# Altium schematic symbol library 724452_RPL-HX_Mobile_AEP_Rev0p91_Library.SchLib: 162 symbols (part 3 of 5) (continued)
## DDR5_SODIMM_2X131_2EM (continued)
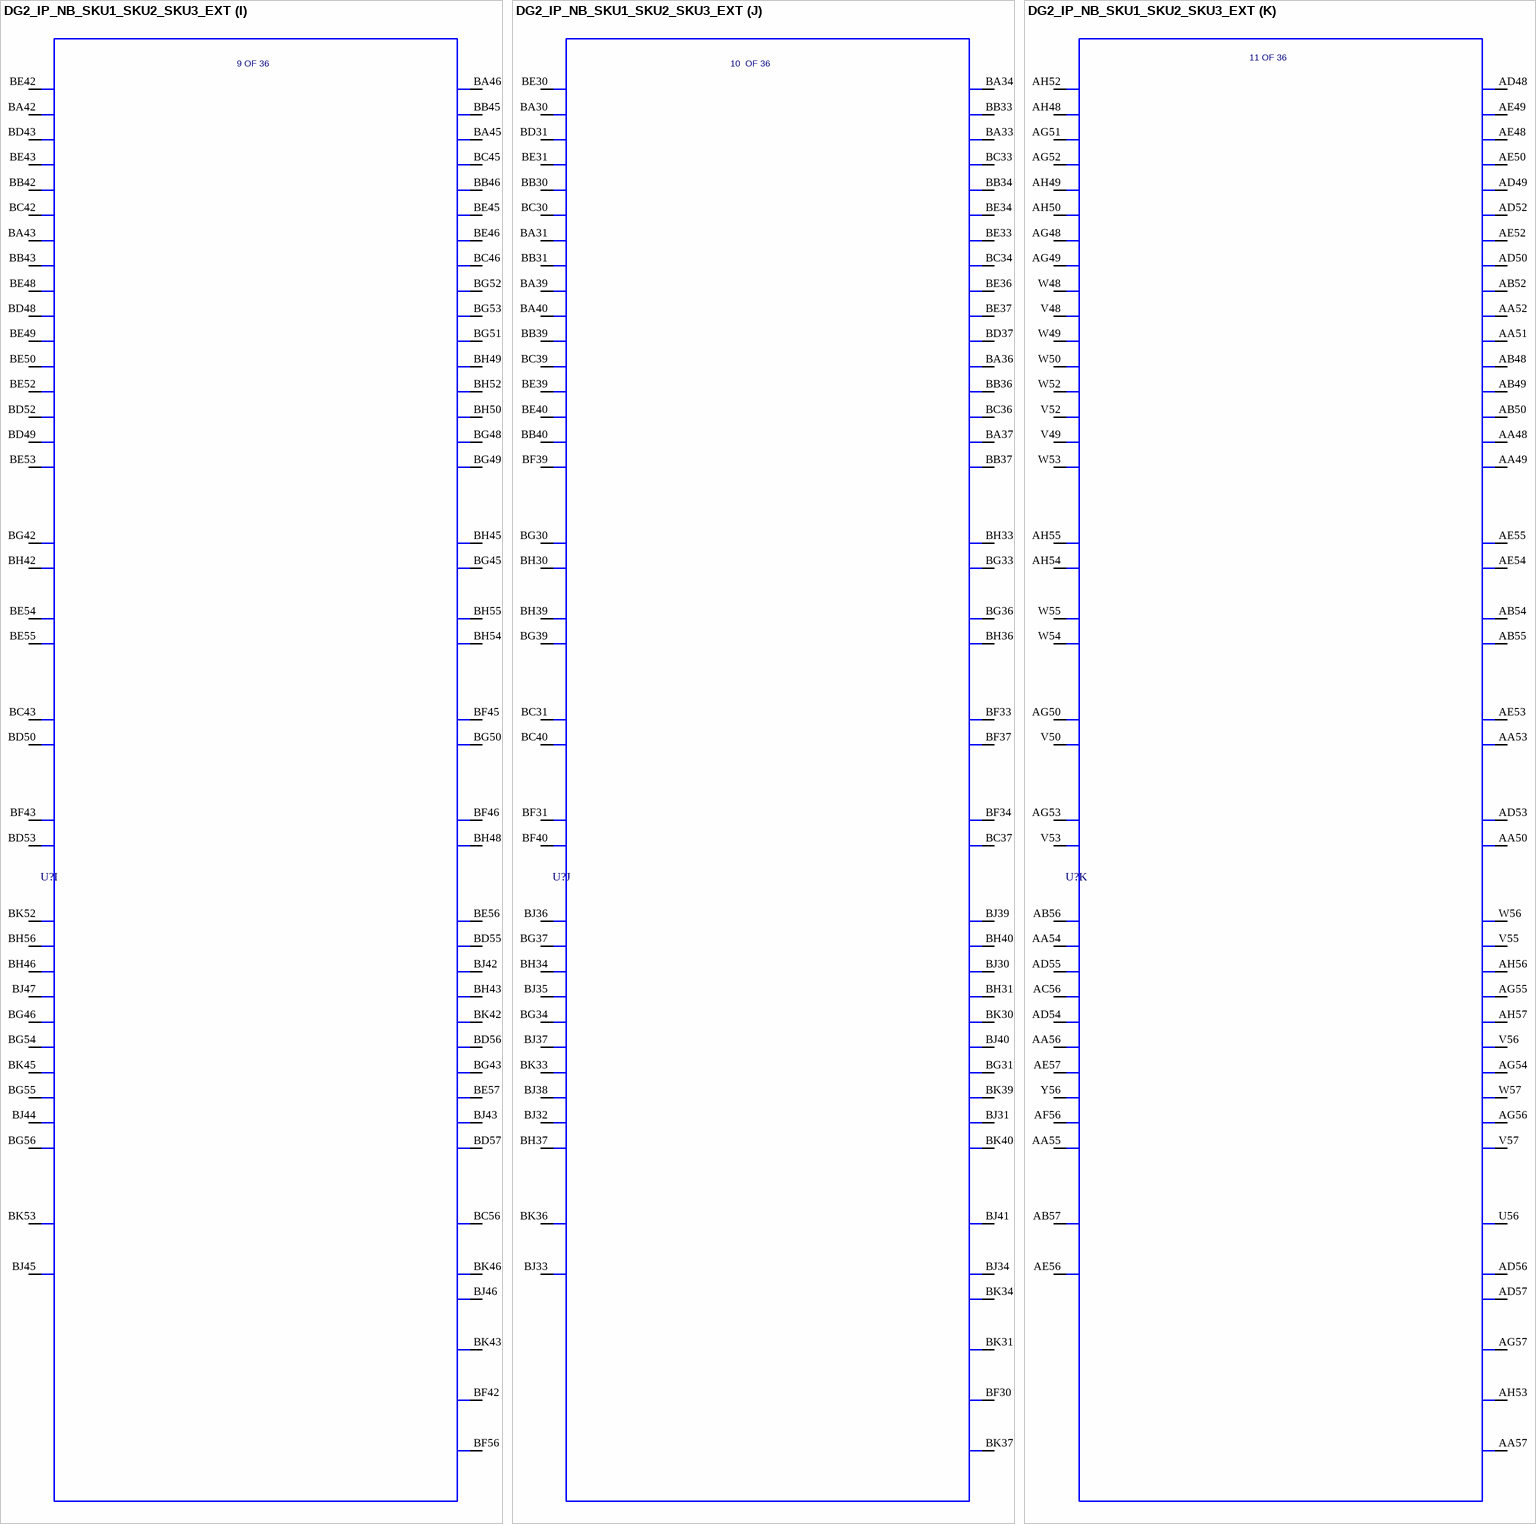
[diagram p30: symbol DG2_IP_NB_SKU1_SKU2_SKU3_EXT]
part A text: DQS4_A_N; DQS3_A_N; DQS2_A_N; DQS1_A_N; DQS0_A_N; CK1_A_N; CK0_A_N
part B text: DQS4_B_N; DQS3_B_N; DQS2_B_N; DQS1_B_N; DQS0_B_N; CK1_B_N; CK0_B_N
part C text: VIN_BULK; RFU; MP; VSS

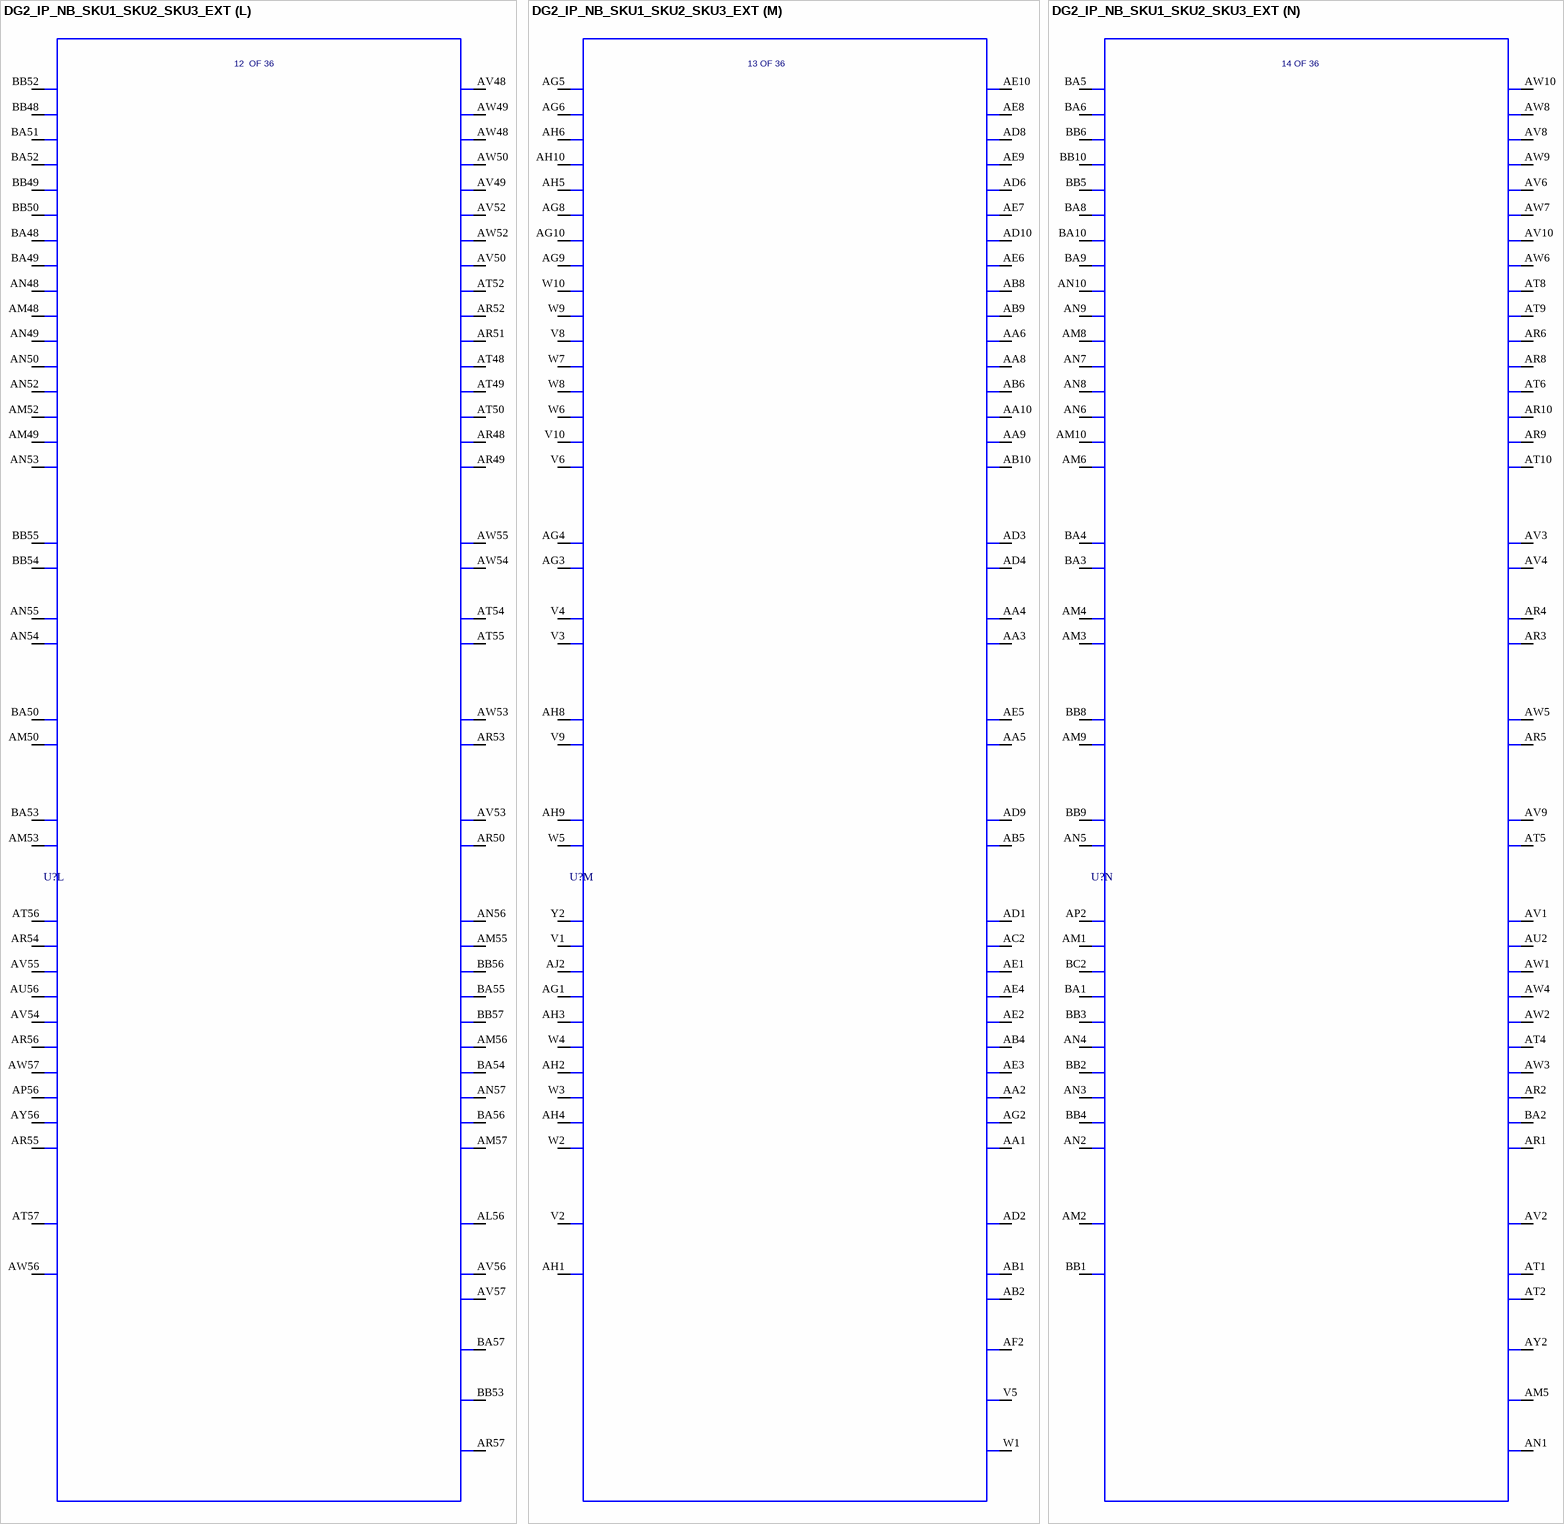
[diagram p31: symbol DG2_IP_NB_SKU1_SKU2_SKU3_EXT]

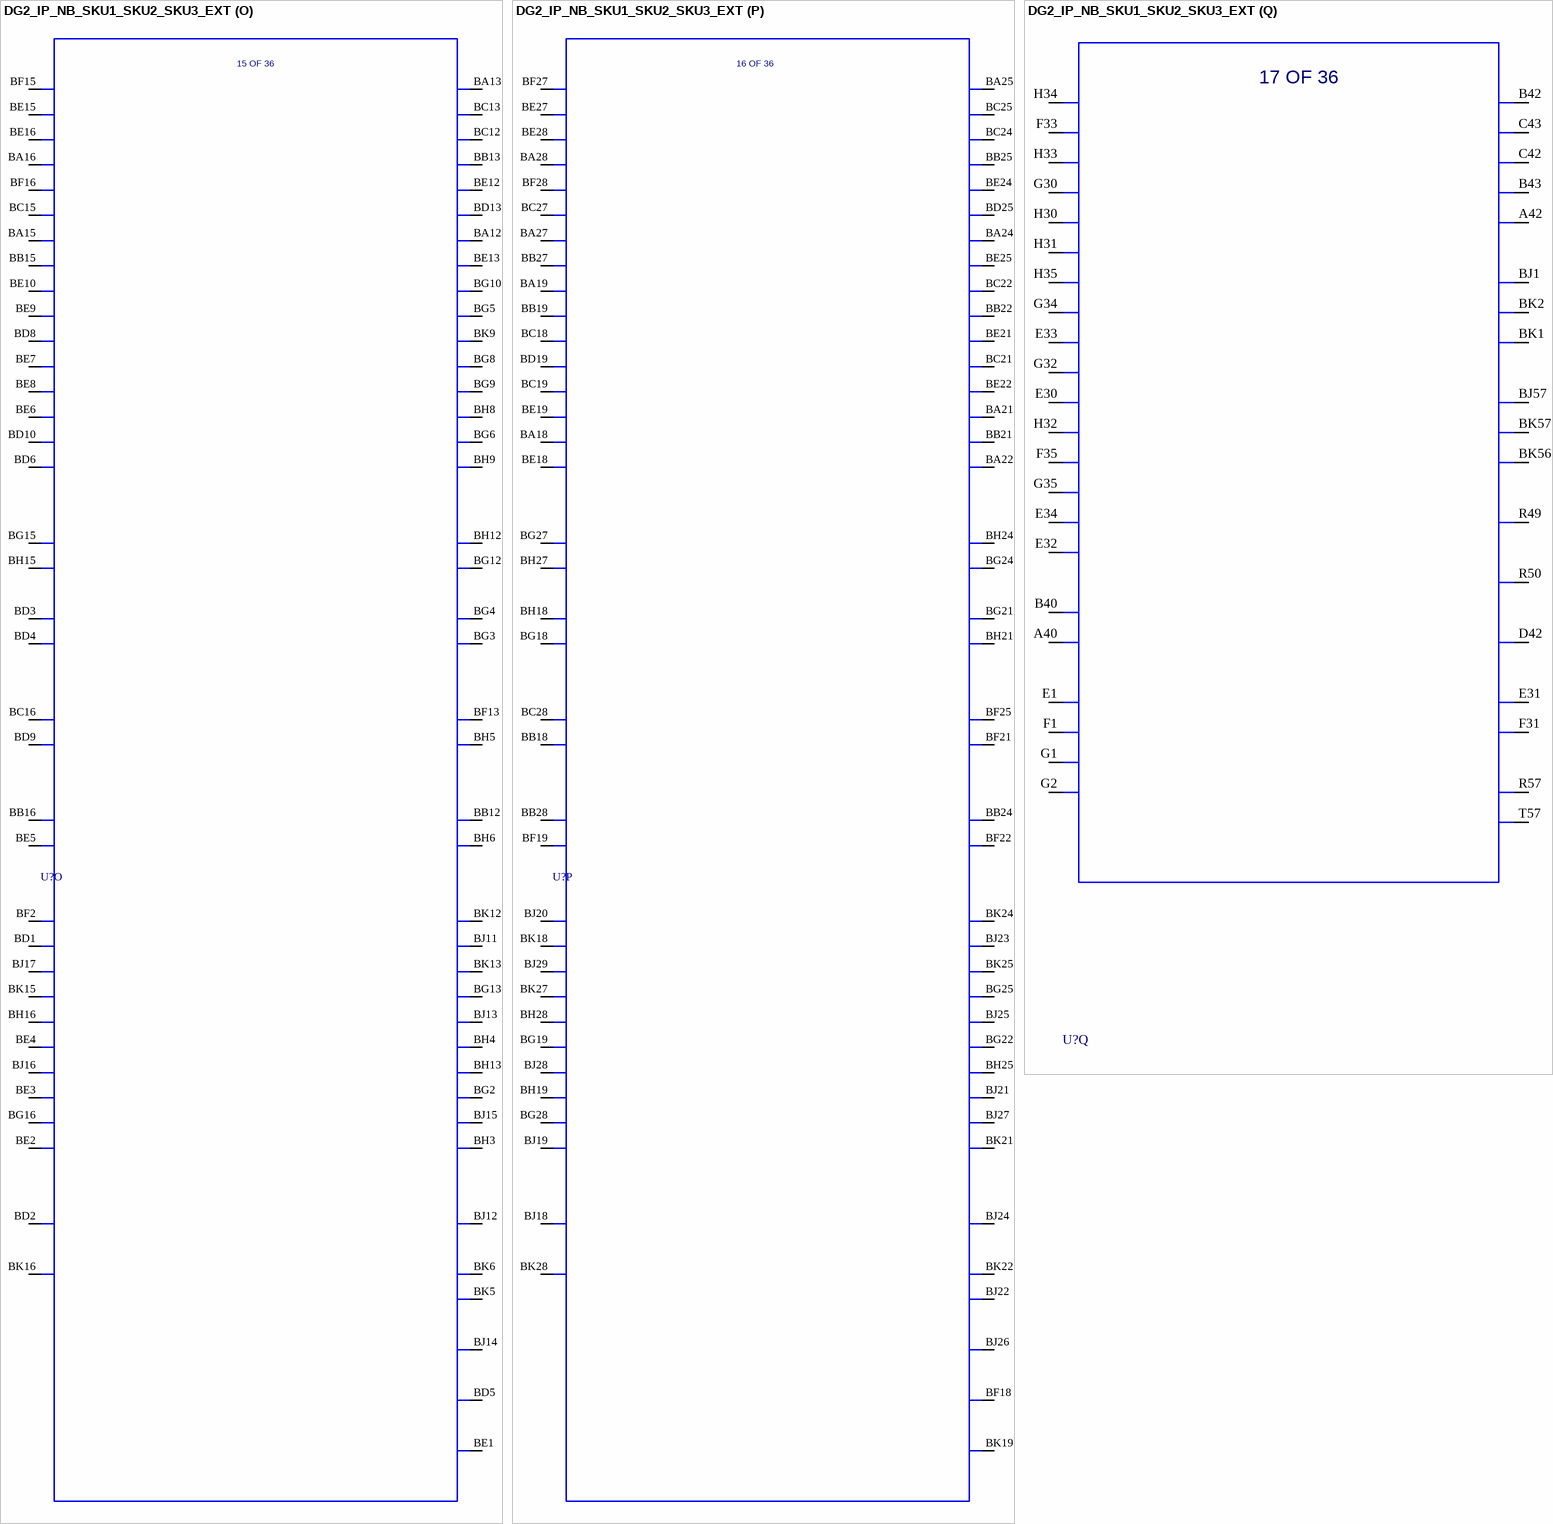
[diagram p32: symbol DG2_IP_NB_SKU1_SKU2_SKU3_EXT]

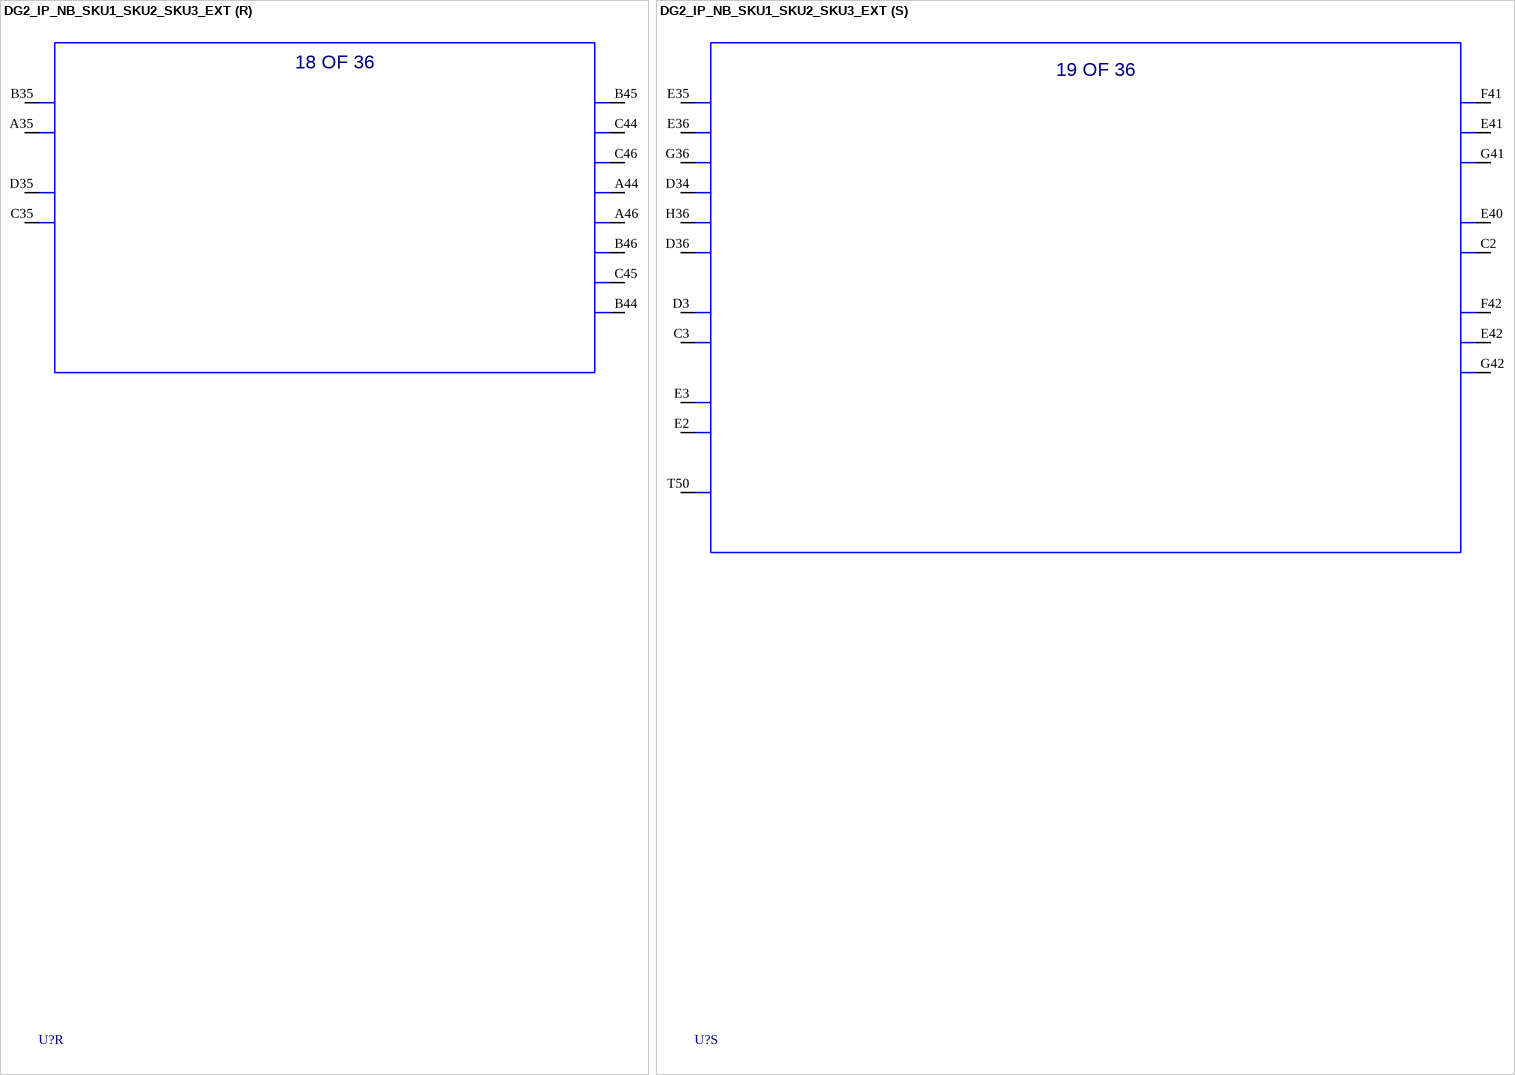
[diagram p33: symbol DG2_IP_NB_SKU1_SKU2_SKU3_EXT]

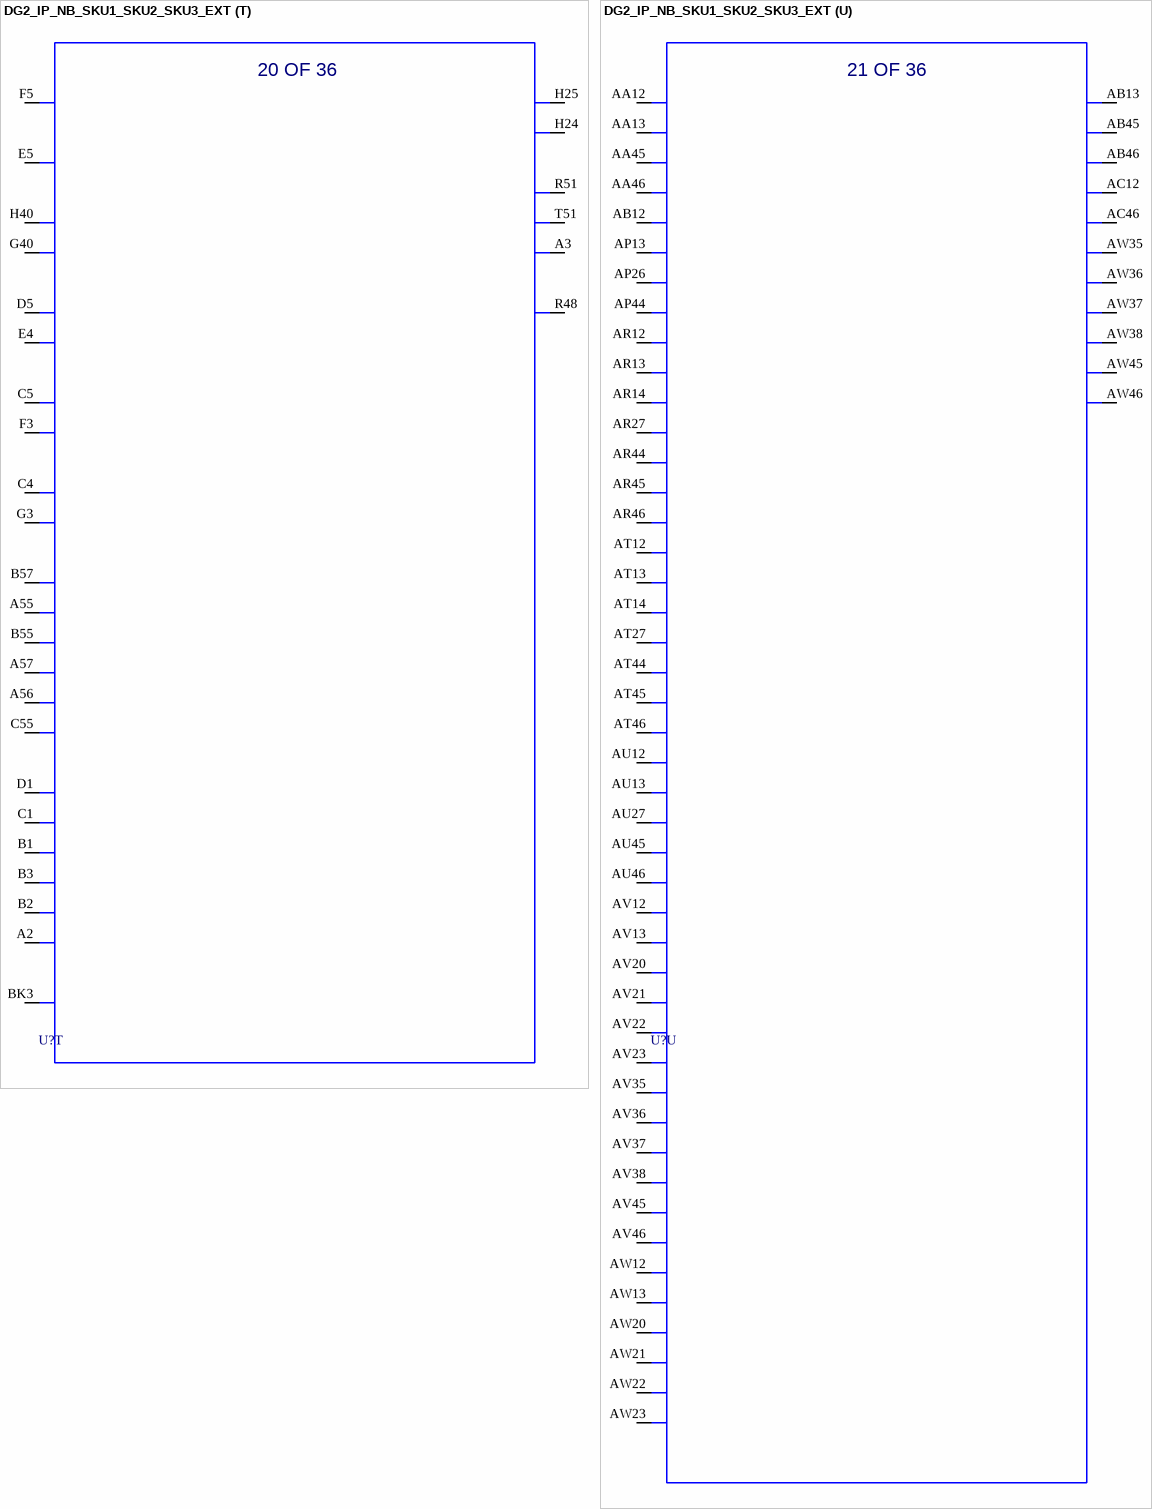
[diagram p34: symbol DG2_IP_NB_SKU1_SKU2_SKU3_EXT]

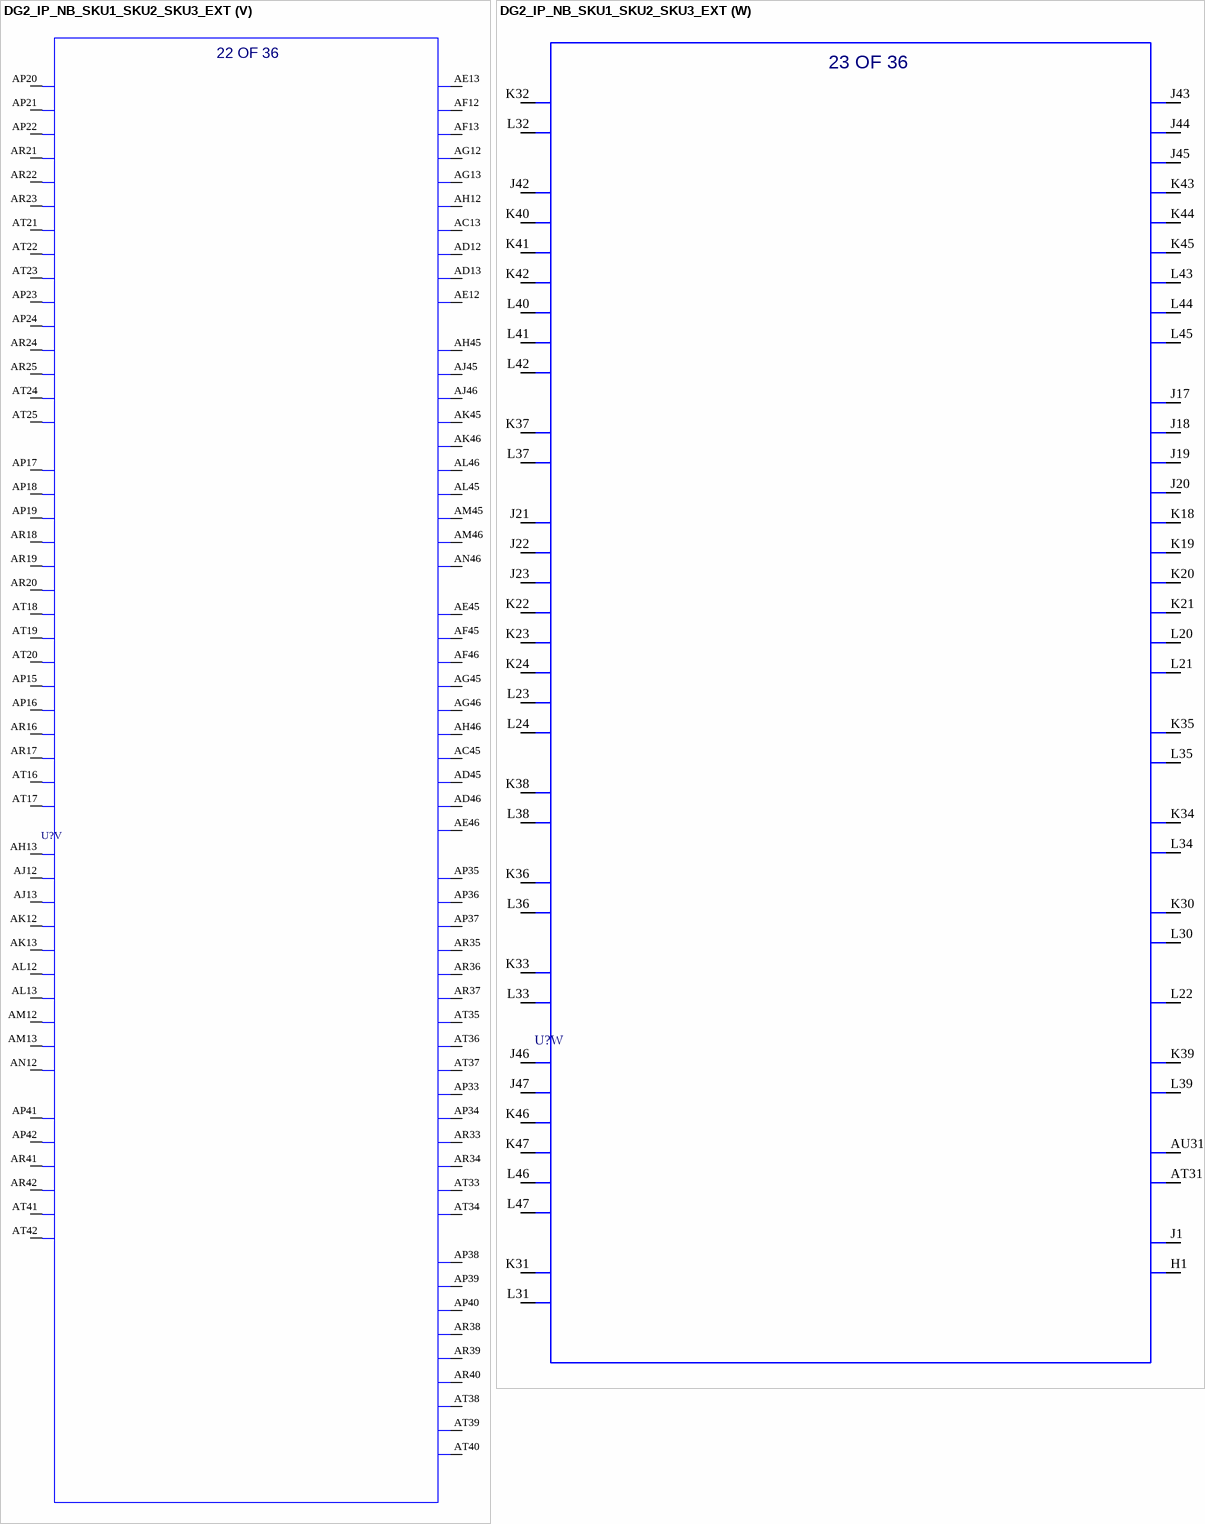
[diagram p35: symbol DG2_IP_NB_SKU1_SKU2_SKU3_EXT]

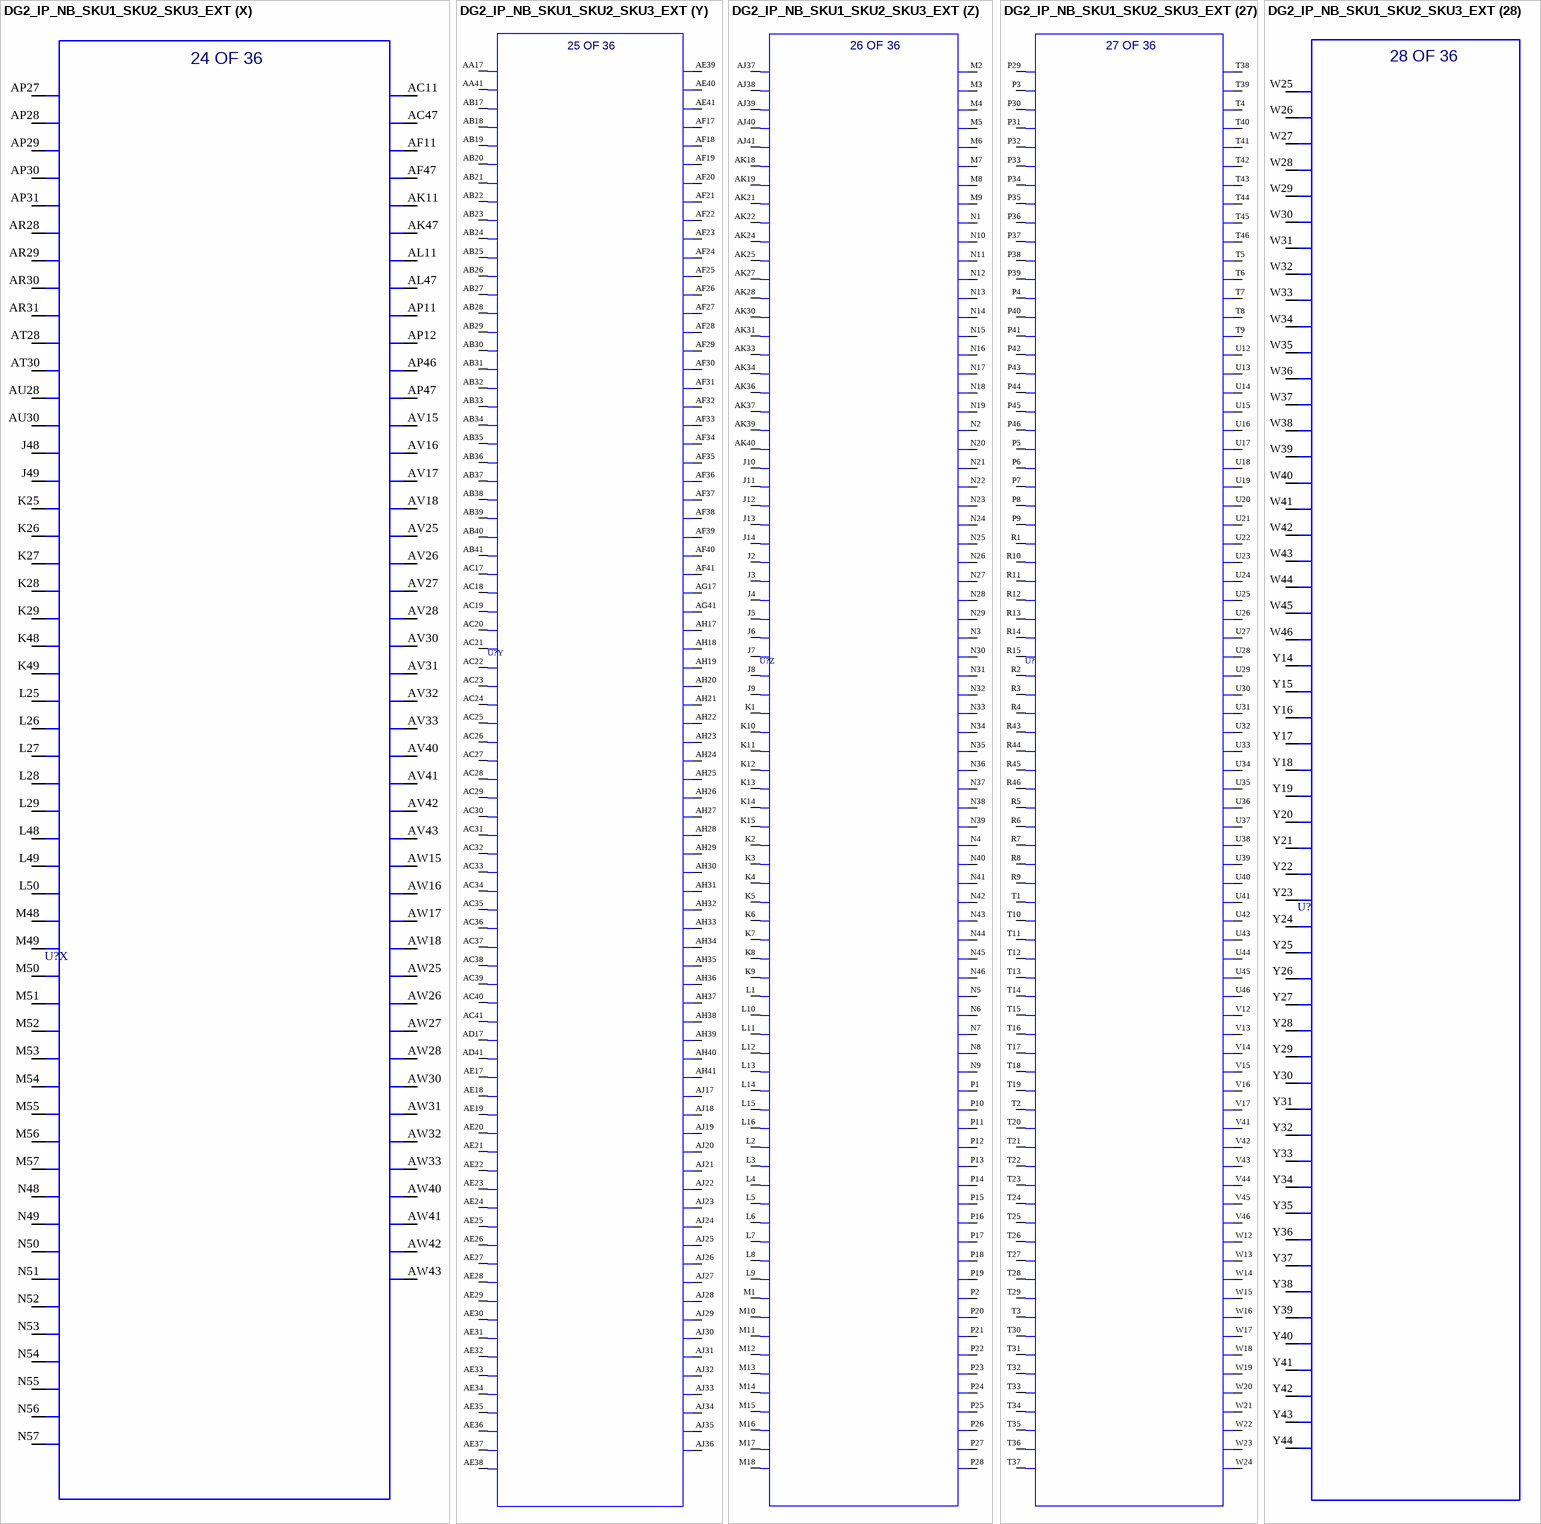
[diagram p36: symbol DG2_IP_NB_SKU1_SKU2_SKU3_EXT]

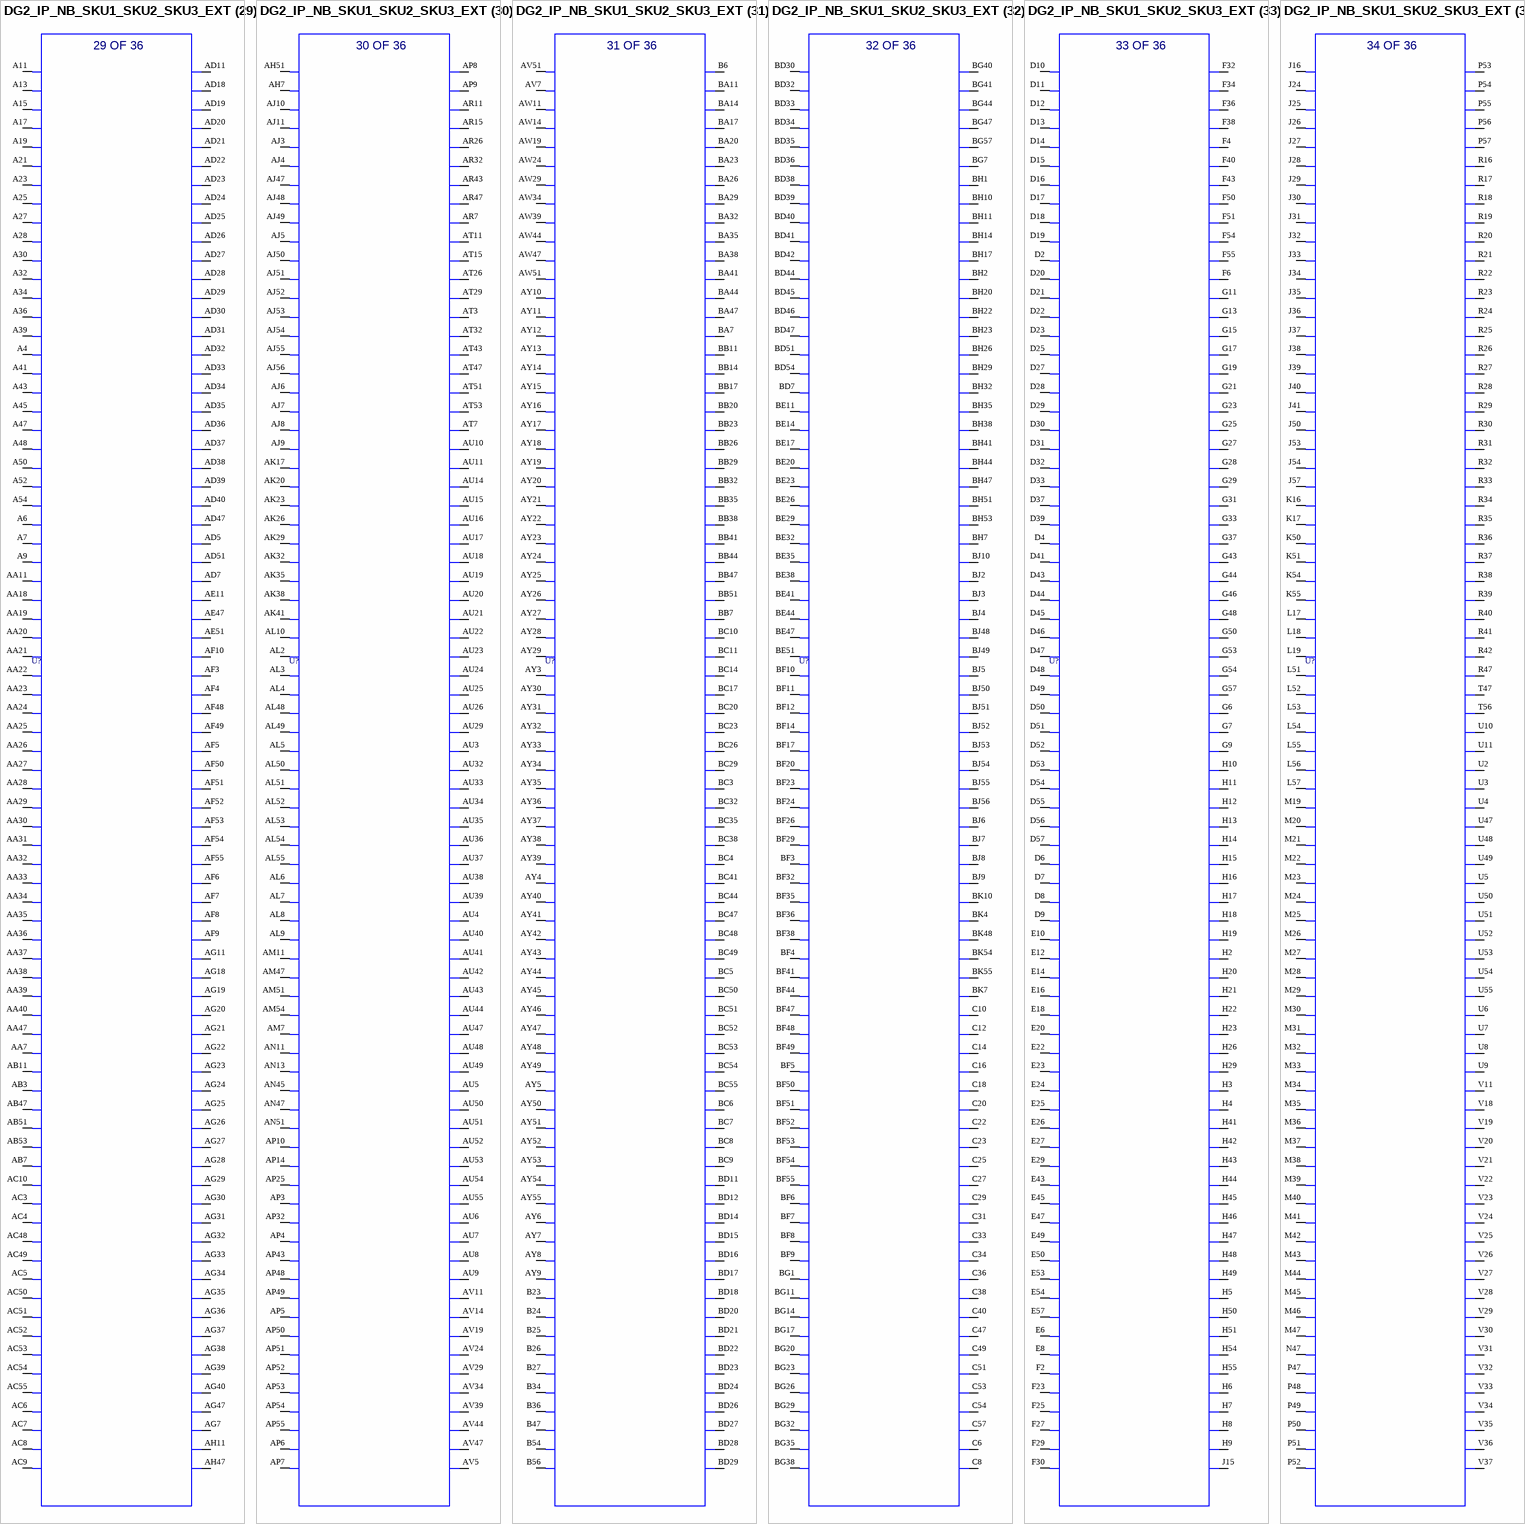
[diagram p37: symbol DG2_IP_NB_SKU1_SKU2_SKU3_EXT]

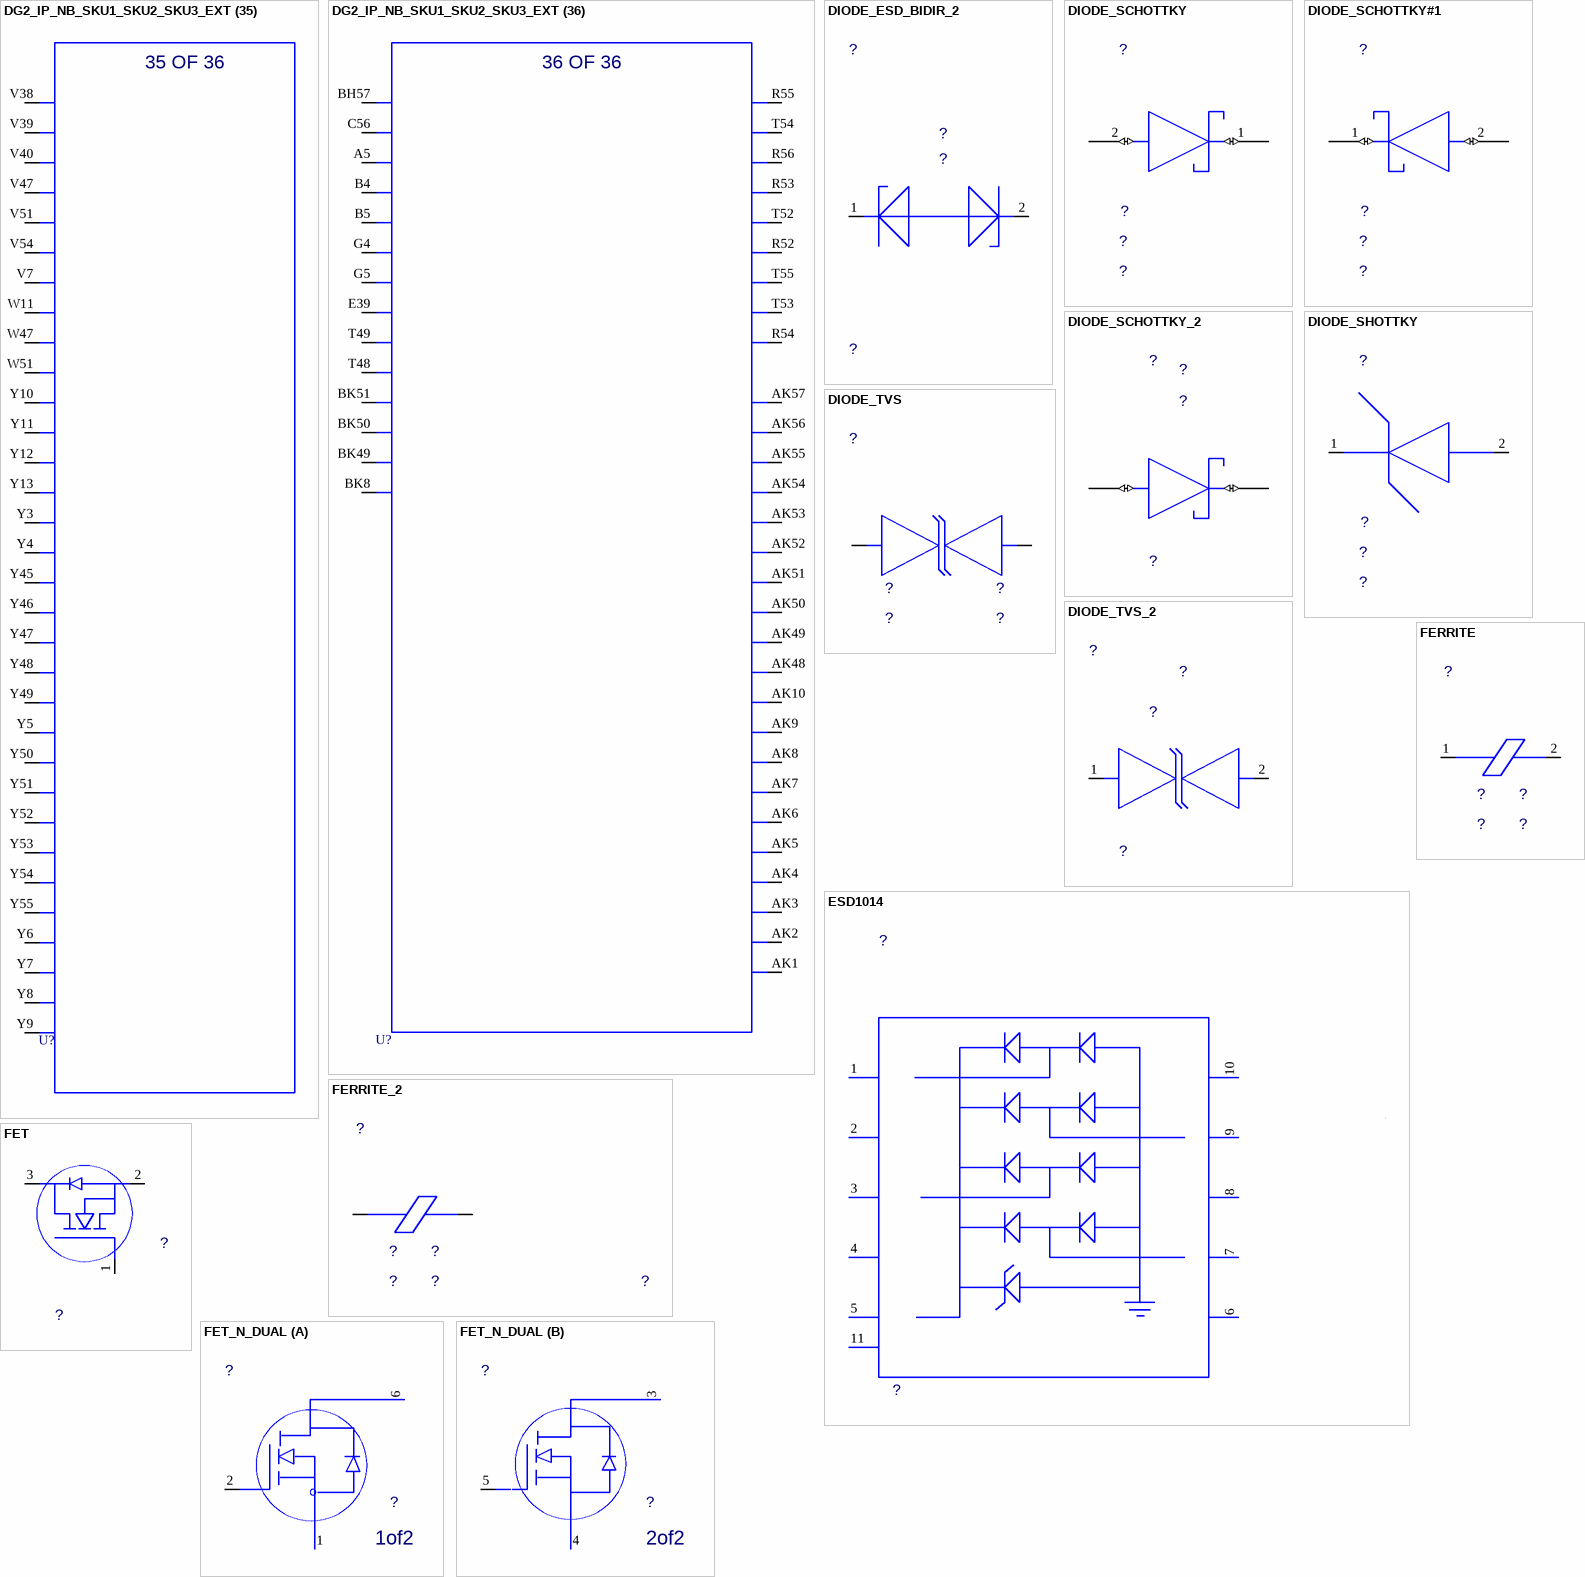
[diagram p38: symbols DG2_IP_NB_SKU1_SKU2_SKU3_EXT to FET_N_DUAL]